# Altium footprint library JL_PCB.PCBLIB: 1112 footprints (part 31 of 71)
Each footprint in its own frame and in the unit in brackets; x right, y up, seen from the top. Pads: shape width x height; smd on the part's side, far side on the other; paste and mask are expansions set on the pad; w line width, h text height; cw(c..) or ccw(c..) is an arc to the next point about the centre after c.
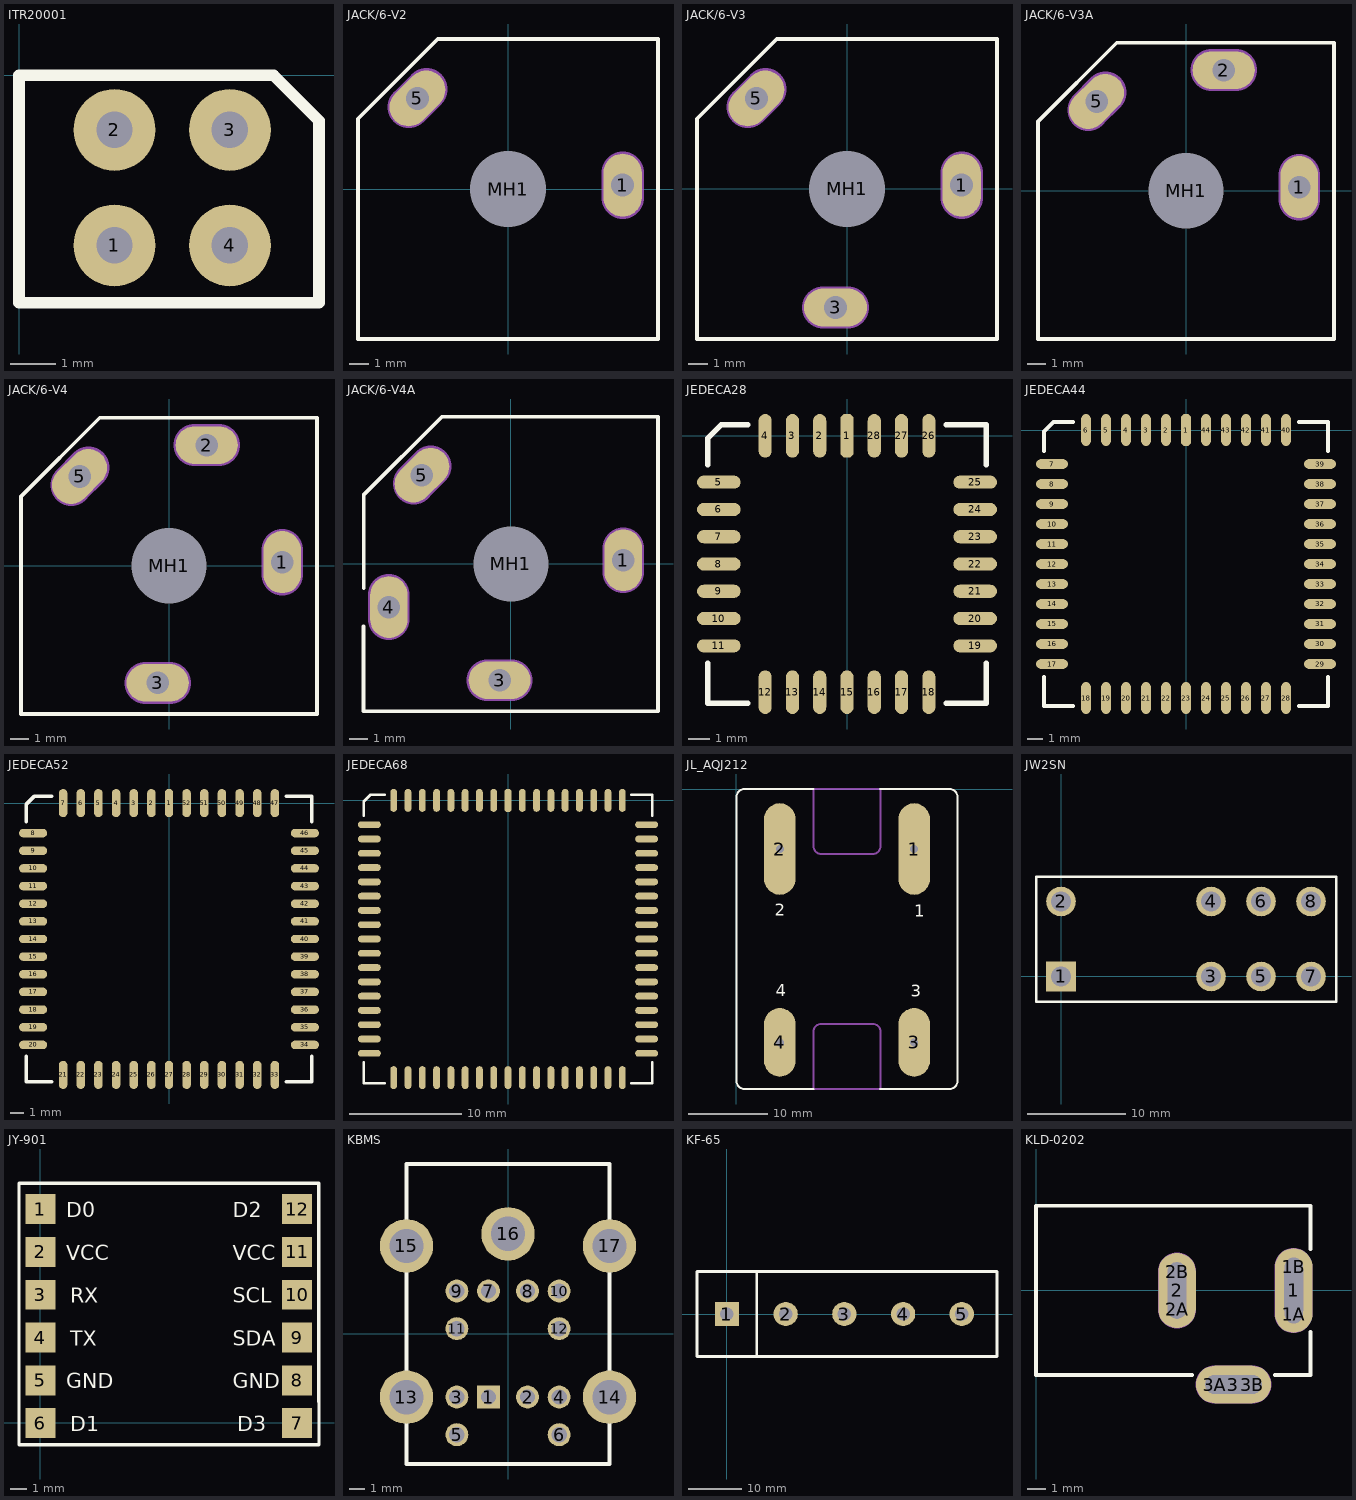
[diagram p30: the footprints below, top view; thin cyan lines are the x and y axes]

## ITR20001 [mm]
pads (4):
  round 1.8 hole 0.8 paste+0: 1(2.1,-3.74)
  round 1.8 hole 0.8: 2(2.1,-1.2) 3(4.64,-1.2) 4(4.64,-3.74)
TopOverlay:
  lines w0.254: 0,-5 6.6,-5 6.6,-1 5.6,0 0,0 0,-5

## JACK/6-V2 [mm] "Connector; Jack Socket, 1/4\" [6.5mm], Thru-Hole, 2 Position, Vertical, Body 15.7 x 15.7 x 31 mm (WxTxH)"
height 31.1
pads (3):
  oval 2x3.3 hole 1.2: 1(6,0.2)
  oval 2x3.3 hole 1.2 rot 135: 5(-4.738,4.738)
  round 3.7 hole 4: MH1(0,0)
TopOverlay:
  lines w0.2: -7.85,-7.85 7.85,-7.85 7.85,7.85 -3.675,7.85 -7.85,3.675 -7.85,-7.85
Mechanical1:
  lines w1.2: -5.185,4.295 -4.266,5.214 ; 6,-0.45 6,0.85
  text "Alert PCB fab to slot details" at -7.9,9.66 h0.3
  text "Slot 1.2x2.5mm, PTH" at -7.9,9.16 h0.3
  text "Assign keep-out area to slot" at -7.9,10.16 h0.3
  text "Mech 1 - Slot cut-out" at -7.9,8.66 h0.3
  text "Mech 2 - Clearance, move to internal plane if present" at -7.9,8.16 h0.3
Mechanical2:
  lines w2.216: -5.185,4.295 -4.266,5.214 ; 6,-0.45 6,0.85

## JACK/6-V3 [mm] "Connector; Jack Socket, 1/4\" [6.5mm], Thru-Hole, 3 Position, Vertical, Body 15.7 x 15.7 x 31 mm (WxTxH)"
height 31.1
pads (4):
  oval 2x3.3 hole 1.2: 1(6,0.2)
  oval 3.3x2 hole 1.2: 3(-0.6,-6.2)
  oval 2x3.3 hole 1.2 rot 135: 5(-4.738,4.738)
  round 3.7 hole 4: MH1(0,0)
TopOverlay:
  lines w0.2: -7.85,-7.85 7.85,-7.85 7.85,7.85 -3.675,7.85 -7.85,3.675 -7.85,-7.85
Mechanical1:
  lines w1.2: -5.185,4.295 -4.266,5.214 ; -1.25,-6.2 0.05,-6.2 ; 6,-0.45 6,0.85
  text "Alert PCB fab to slot details" at -7.9,9.66 h0.3
  text "Slot 1.2x2.5mm, PTH" at -7.9,9.16 h0.3
  text "Assign keep-out area to slot" at -7.9,10.16 h0.3
  text "Mech 1 - Slot cut-out" at -7.9,8.66 h0.3
  text "Mech 2 - Clearance, move to internal plane if present" at -7.9,8.16 h0.3
Mechanical2:
  lines w2.216: -5.185,4.295 -4.266,5.214 ; -1.25,-6.2 0.05,-6.2 ; 6,-0.45 6,0.85

## JACK/6-V3A [mm] "Connector; Jack Socket, 1/4\" [6.5mm], Thru-Hole, 3 Position, Vertical, Body 15.7 x 15.7 x 31 mm (WxTxH)"
height 31.1
pads (4):
  oval 2x3.3 hole 1.2: 1(6,0.2)
  oval 3.3x2 hole 1.2: 2(2,6.4)
  oval 2x3.3 hole 1.2 rot 135: 5(-4.738,4.738)
  round 3.7 hole 4: MH1(0,0)
TopOverlay:
  lines w0.2: -7.85,-7.85 7.85,-7.85 7.85,7.85 -3.675,7.85 -7.85,3.675 -7.85,-7.85
Mechanical1:
  lines w1.2: -5.185,4.295 -4.266,5.214 ; 1.35,6.4 2.65,6.4 ; 6,-0.45 6,0.85
  text "Mech 2 - Clearance, move to internal plane if present" at -7.9,8.16 h0.3
  text "Mech 1 - Slot cut-out" at -7.9,8.66 h0.3
  text "Assign keep-out area to slot" at -7.9,10.16 h0.3
  text "Slot 1.2x2.5mm, PTH" at -7.9,9.16 h0.3
  text "Alert PCB fab to slot details" at -7.9,9.66 h0.3
Mechanical2:
  lines w2.216: -5.185,4.295 -4.266,5.214 ; 1.35,6.4 2.65,6.4 ; 6,-0.45 6,0.85

## JACK/6-V4 [mm] "Connector; Jack Socket, 1/4\" [6.5mm], Thru-Hole, 4 Position, Vertical, Body 15.7 x 15.7 x 31 mm (WxTxH)"
height 31.1
pads (5):
  oval 2x3.3 hole 1.2: 1(6,0.2)
  oval 3.3x2 hole 1.2: 2(2,6.4) 3(-0.6,-6.2)
  oval 2x3.3 hole 1.2 rot 135: 5(-4.738,4.738)
  round 3.7 hole 4: MH1(0,0)
TopOverlay:
  lines w0.2: -7.85,-7.85 -7.85,3.675 -3.675,7.85 7.85,7.85 7.85,-7.85 -7.85,-7.85
Mechanical1:
  lines w1.2: -5.185,4.295 -4.266,5.214 ; -1.25,-6.2 0.05,-6.2 ; 1.35,6.4 2.65,6.4 ; 6,-0.45 6,0.85
  text "Alert PCB fab to slot details" at -7.9,9.66 h0.3
  text "Slot 1.2x2.5mm, PTH" at -7.9,9.16 h0.3
  text "Assign keep-out area to slot" at -7.9,10.16 h0.3
  text "Mech 1 - Slot cut-out" at -7.9,8.66 h0.3
  text "Mech 2 - Clearance, move to internal plane if present" at -7.9,8.16 h0.3
Mechanical2:
  lines w2.216: -5.185,4.295 -4.266,5.214 ; -1.25,-6.2 0.05,-6.2 ; 1.35,6.4 2.65,6.4 ; 6,-0.45 6,0.85

## JACK/6-V4A [mm] "Connector; Jack Socket, 1/4\" [6.5mm], Thru-Hole, 4 Position, Vertical, Body 15.7 x 15.7 x 31 mm (WxTxH)"
height 31.1
pads (5):
  oval 2x3.3 hole 1.2: 1(6,0.2) 4(-6.5,-2.3)
  oval 3.3x2 hole 1.2: 3(-0.6,-6.2)
  oval 2x3.3 hole 1.2 rot 135: 5(-4.738,4.738)
  round 3.7 hole 4: MH1(0,0)
TopOverlay:
  lines w0.2: -7.85,-3.32 -7.85,-7.85 7.85,-7.85 7.85,7.85 -3.675,7.85 -7.85,3.675 -7.85,-1.28
Mechanical1:
  lines w1.2: -6.5,-2.95 -6.5,-1.65 ; -5.185,4.295 -4.266,5.214 ; -1.25,-6.2 0.05,-6.2 ; 6,-0.45 6,0.85
  text "Mech 2 - Clearance, move to internal plane if present" at -7.9,8.16 h0.3
  text "Mech 1 - Slot cut-out" at -7.9,8.66 h0.3
  text "Assign keep-out area to slot" at -7.9,10.16 h0.3
  text "Slot 1.2x2.5mm, PTH" at -7.9,9.16 h0.3
  text "Alert PCB fab to slot details" at -7.9,9.66 h0.3
Mechanical2:
  lines w2.216: -6.5,-2.95 -6.5,-1.65 ; -5.185,4.295 -4.266,5.214 ; -1.25,-6.2 0.05,-6.2 ; 6,-0.45 6,0.85

## JEDECA28 [mil]
pads (28):
  oct 24x80 smd: 1(0,0)
  oval 24x80 smd: 2(-50,0) 3(-100,0) 4(-150,0) 12(-150,-470) 13(-100,-470) 14(-50,-470) 15(0,-470) 16(50,-470) 17(100,-470) 18(150,-470) 26(150,0) 27(100,0) 28(50,0)
  oval 80x24 smd: 5(-235,-85) 6(-235,-135) 7(-235,-185) 8(-235,-235) 9(-235,-285) 10(-235,-335) 11(-235,-385) 19(235,-385) 20(235,-335) 21(235,-285) 22(235,-235) 23(235,-185) 24(235,-135) 25(235,-85)
TopOverlay:
  lines w10: -255,-417 -255,-490 -182,-490 ; -255,-53 -255,-4 -231,20 -182,20 ; 182,-490 255,-490 255,-417 ; 182,20 255,20 255,-53

## JEDECA44 [mil]
pads (44):
  oct 24x80 smd: 1(0,0)
  oval 24x80 smd: 2(-50,0) 3(-100,0) 4(-150,0) 5(-200,0) 6(-250,0) 18(-250,-670) 19(-200,-670) 20(-150,-670) 21(-100,-670) 22(-50,-670) 23(0,-670) 24(50,-670) 25(100,-670) 26(150,-670) 27(200,-670) 28(250,-670) 40(250,0) 41(200,0) 42(150,0) 43(100,0) 44(50,0)
  oval 80x24 smd: 7(-335,-85) 8(-335,-135) 9(-335,-185) 10(-335,-235) 11(-335,-285) 12(-335,-335) 13(-335,-385) 14(-335,-435) 15(-335,-485) 16(-335,-535) 17(-335,-585) 29(335,-585) 30(335,-535) 31(335,-485) 32(335,-435) 33(335,-385) 34(335,-335) 35(335,-285) 36(335,-235) 37(335,-185) 38(335,-135) 39(335,-85)
TopOverlay:
  lines w10: -355,-617 -355,-690 -282,-690 ; -355,-53 -355,-4 -331,20 -282,20 ; 282,-690 355,-690 355,-617 ; 282,20 355,20 355,-53

## JEDECA52 [mil]
pads (52):
  oct 24x80 smd: 1(0,0)
  oval 24x80 smd: 2(-50,0) 3(-100,0) 4(-150,0) 5(-200,0) 6(-250,0) 7(-300,0) 21(-300,-770) 22(-250,-770) 23(-200,-770) 24(-150,-770) 25(-100,-770) 26(-50,-770) 27(0,-770) 28(50,-770) 29(100,-770) 30(150,-770) 31(200,-770) 32(250,-770) 33(300,-770) 47(300,0) 48(250,0) 49(200,0) 50(150,0) 51(100,0) 52(50,0)
  oval 80x24 smd: 8(-385,-85) 9(-385,-135) 10(-385,-185) 11(-385,-235) 12(-385,-285) 13(-385,-335) 14(-385,-385) 15(-385,-435) 16(-385,-485) 17(-385,-535) 18(-385,-585) 19(-385,-635) 20(-385,-685) 34(385,-685) 35(385,-635) 36(385,-585) 37(385,-535) 38(385,-485) 39(385,-435) 40(385,-385) 41(385,-335) 42(385,-285) 43(385,-235) 44(385,-185) 45(385,-135) 46(385,-85)
TopOverlay:
  lines w10: -405,-717 -405,-790 -332,-790 ; -405,-53 -405,-4 -381,20 -332,20 ; 332,-790 405,-790 405,-717 ; 332,20 405,20 405,-53

## JEDECA68 [mil]
pads (68):
  oct 24x80 smd: 1(0,0)
  oval 24x80 smd: 2(-50,0) 3(-100,0) 4(-150,0) 5(-200,0) 6(-250,0) 7(-300,0) 8(-350,0) 9(-400,0) 27(-400,-970) 28(-350,-970) 29(-300,-970) 30(-250,-970) 31(-200,-970) 32(-150,-970) 33(-100,-970) 34(-50,-970) 35(0,-970) 36(50,-970) 37(100,-970) 38(150,-970) 39(200,-970) 40(250,-970) 41(300,-970) 42(350,-970) 43(400,-970) 61(400,0) 62(350,0) 63(300,0) 64(250,0) 65(200,0) 66(150,0) 67(100,0) 68(50,0)
  oval 80x24 smd: 10(-485,-85) 11(-485,-135) 12(-485,-185) 13(-485,-235) 14(-485,-285) 15(-485,-335) 16(-485,-385) 17(-485,-435) 18(-485,-485) 19(-485,-535) 20(-485,-585) 21(-485,-635) 22(-485,-685) 23(-485,-735) 24(-485,-785) 25(-485,-835) 26(-485,-885) 44(485,-885) 45(485,-835) 46(485,-785) 47(485,-735) 48(485,-685) 49(485,-635) 50(485,-585) 51(485,-535) 52(485,-485) 53(485,-435) 54(485,-385) 55(485,-335) 56(485,-285) 57(485,-235) 58(485,-185) 59(485,-135) 60(485,-85)
TopOverlay:
  lines w10: -505,-917 -505,-990 -432,-990 ; -505,-53 -505,-4 -481,20 -432,20 ; 432,-990 505,-990 505,-917 ; 432,20 505,20 505,-53

## JL_AQJ212 [mm]
height 17
pads (4):
  oval 4x11.6 hole 1: 1(22.5,-7.6) 2(5.5,-7.6)
  oval 4x8.7 hole 1: 3(22.5,-32.1) 4(5.5,-32.1)
TopOverlay:
  lines w0.254: 9.754,-37.998 9.752,-38 1,-38 cw(c1,-37) 0,-37 0,-1 cw(c1,-1) 1,0 9.779,0 ; 18.212,-37.998 18.213,-38 27,-38 ccw(c27,-37) 28,-37 28,-1 ccw(c27,-1) 27,0 18.212,0
  text "1" at 22.504,-16.18 h1.52
  text "2" at 4.826,-16.078 h1.52
  text "4" at 4.978,-26.264 h1.52
  text "3" at 22.098,-26.289 h1.52
Mechanical1:
  lines w0.254: 5,-11.8 ccw(c5.5,-11.3) 6,-11.8 6,-3.3 ccw(c5.5,-3.8) 5,-3.3 5,-11.8 ; 5.15,-34.95 ccw(c5.5,-34.6) 5.85,-34.95 5.85,-28.35 ccw(c5.5,-28.7) 5.15,-28.35 5.15,-34.95 ; 9.75,-38 18.25,-38 18.25,-30.75 ccw(c17.25,-30.75) 17.25,-29.75 10.75,-29.75 ccw(c10.75,-30.75) 9.75,-30.75 9.75,-38 ; 9.75,-7.25 ccw(c10.75,-7.25) 10.75,-8.25 17.25,-8.25 ccw(c17.25,-7.25) 18.25,-7.25 18.25,0 9.75,0 9.75,-7.25 ; 22,-11.8 ccw(c22.5,-11.3) 23,-11.8 23,-3.3 ccw(c22.5,-3.8) 22,-3.3 22,-11.8 ; 22.15,-34.95 ccw(c22.5,-34.6) 22.85,-34.95 22.85,-28.35 ccw(c22.5,-28.7) 22.15,-28.35 22.15,-34.95

## JW2SN [mm]
pads (8):
  rect 3x3 hole 2: 1(0,0)
  round 3 hole 2: 2(0,7.62) 3(15.24,0) 4(15.24,7.62) 5(20.32,0) 6(20.32,7.62) 7(25.4,0) 8(25.4,7.62)
TopOverlay:
  lines w0.254: -2.54,-2.54 -2.54,10.16 27.94,10.16 27.94,-2.54 -2.54,-2.54

## JY-901 [mil]
pads (12):
  rect 70x70 smd: 1(0.63,499.63) 2(0.63,399.63) 3(0.63,299.63) 4(0.63,199.63) 5(0.63,99.63) 6(0.63,-0.37) 7(600.63,-0.37) 8(600.63,99.63) 9(600.63,199.63) 10(600.63,299.63) 11(600.63,399.63) 12(600.63,499.63)
TopOverlay:
  lines w7.87: -49.37,49.63 -49.37,449.63 ; 650.63,449.63 650.63,49.63 651.63,49.63
  lines w8: -49.37,49.63 -49.37,-51.37 651.63,-51.37 651.63,49.63 ; -49.37,449.63 -49.37,560.63 650.63,560.63 650.63,449.63
  text "D3" at 460.63,-19.37 h35
  text "D2" at 450.63,480.63 h35
  text "D1" at 70.63,-19.37 h35
  text "D0" at 60.63,480.63 h35
  text "SCL" at 450.63,280.63 h35
  text "SDA" at 450.63,180.63 h35
  text "TX" at 70.63,180.63 h35
  text "RX" at 70.63,280.63 h35
  text "GND" at 450.63,80.63 h35
  text "GND" at 60.63,80.63 h35
  text "VCC" at 450.63,380.63 h35
  text "VCC" at 60.63,380.63 h35

## KBMS [mil]
pads (17):
  rect 60x60 / inner round 60 / far side round 60 hole 40: 1(-51.18,-165.24)
  round 60 hole 40: 2(51.18,-165.24) 3(-133.86,-165.24) 4(133.86,-165.24) 5(-133.86,-263.66) 6(133.86,-263.66) 7(-51.18,112.32) 8(51.18,112.32) 9(-133.86,112.32) 10(133.86,112.32) 11(-133.86,13.9) 12(133.86,13.9)
  round 140 hole 90: 13(-265.75,-165.24) 14(265.75,-165.24) 15(-265.75,230.43) 16(0,261.93) 17(265.75,230.43)
TopOverlay:
  lines w10: -265.75,-340.43 -265.75,445 265.75,445 265.75,-340.43 -265.75,-340.43

## KF-65 [mil]
pads (5):
  rect 180x180 hole 100: 1(0,0)
  round 180 hole 100: 2(435,0) 3(870,0) 4(1305,0) 5(1740,0)
TopOverlay:
  lines w20: 221,-314.96 221,314.96 ; -222,-314.96 -222,314.96 2001,314.96 2001,-314.96 -222,-314.96

## KLD-0202 [mm] "DC Power Jack, 2.5mm, KLD Series, PCB Mount"
pads (9):
  oval 2x4.5 hole 1 slot 3 at 90 deg: 1(13.7,0)
  round 1.5 hole 1: 1A(13.7,-1.25) 1B(13.7,1.25) 2A(7.5,-1) 2B(7.5,1) 3A(9.5,-5) 3B(11.5,-5)
  oval 2x4 hole 1 slot 3 at 90 deg: 2(7.5,0)
  oval 4x2 hole 1 slot 3 at 0 deg: 3(10.5,-5)
TopOverlay:
  lines w0.2: 8.3,-4.5 0,-4.5 0,4.5 14.6,4.5 14.6,2.2 ; 12.7,-4.5 14.6,-4.5 14.6,-2.2
Mechanical1:
  lines w1: 7.5,-1 7.5,1 ; 9.5,-5 11.5,-5 ; 13.7,-1.25 13.7,1.25
  text "Alert PCB fab to slot details" at 0.286,6.066 h0.3
  text "Assign keep-out area to slot" at 0.286,6.566 h0.3
  text "Mech 1 - Slot cut-out" at 0.286,5.566 h0.3
  text "Mech 2 - Clearance, move to internal plane if present" at 0.286,5.066 h0.3
Mechanical2:
  lines w2.016: 7.5,-1 7.5,1 ; 9.5,-5 11.5,-5 ; 13.7,-1.25 13.7,1.25
3D body "DC-3.5.STEP": height 10.82, standoff -4.18, extent -0.09,-4.493 14.11,4.267